# Altium footprint library Elettronica FM.PcbLib: 387 footprints (part 1 of 25)
Each footprint in its own frame and in the unit in brackets; x right, y up, seen from the top. Pads: shape width x height; smd on the part's side, far side on the other; paste and mask are expansions set on the pad; w line width, h text height; cw(c..) or ccw(c..) is an arc to the next point about the centre after c.
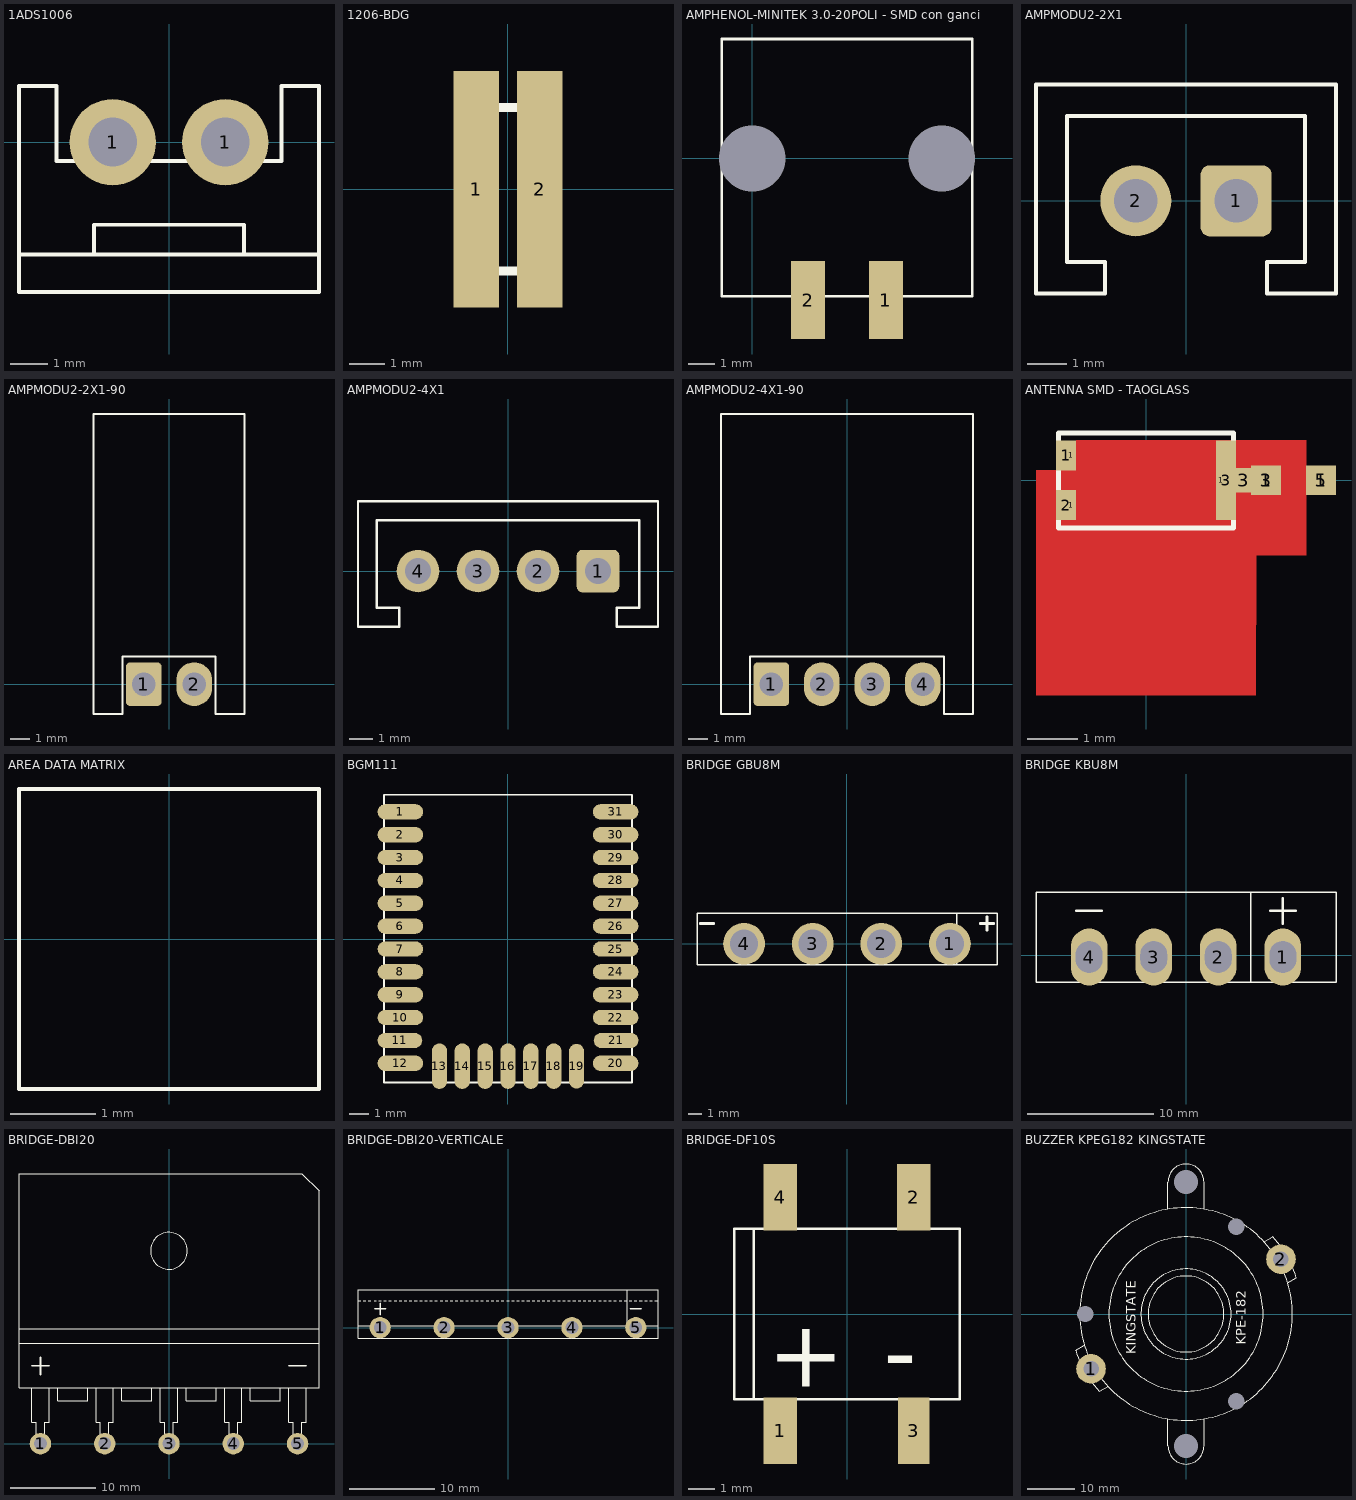
[diagram p0: the footprints below, top view; thin cyan lines are the x and y axes]

## 1ADS1006 [mm]
pads (2):
  round 2.3 hole 1.3: 1(-1.5,0) 1(1.5,0)
Top Overlay:
  lines w0.1: -4,-3 4,-3 ; -2,-3 -2,-2.2 2,-2.2 2,-3 ; -4,-4 -4,1.5 -3,1.5 -3,-0.5 -2,-0.5 -2,0.5 -1,0.5 -1,-0.5 1,-0.5 1,0.5 2,0.5 2,-0.5 3,-0.5 3,1.5 4,1.5 4,-4 -4,-4
3D body: height 9, standoff 0, extent -4,-4 4,-3
3D body: height 1, standoff 0, extent -4,-4 4,1.5
3D body: height 0, standoff -4.5, extent -2,-0.5 -1,0.5
3D body: height 0, standoff -4.5, extent 1,-0.5 2,0.5
3D body: height 6.35, standoff 3.65, extent -1.345,-4.025 1.345,-2.975

## 1206-BDG [mil]
pads (2):
  rect 50x260 smd paste-275.59: 1(-35,0) 2(35,0)
Top Overlay:
  lines w10: -43,-90 -43,90 43,90 43,-90 -43,-90
Top Paste:
  region: 35.74,130.47 35.74,28.11 10.15,28.11 10.15,130.47
  region: 35.59,-27.64 35.59,-130 10,-130 10,-27.64
  region: -9.41,-27.64 -9.41,-130 -35,-130 -35,-27.64
  region: -9.54,130.47 -9.54,28.11 -35.13,28.11 -35.13,130.47
Top Solder:
  region: -9.54,130.47 -9.54,28.11 -35.13,28.11 -35.13,130.47
  region: 35.59,-27.64 35.59,-130 10,-130 10,-27.64
  region: -9.41,-27.64 -9.41,-130 -35,-130 -35,-27.64
  region: 35.74,130.47 35.74,28.11 10.15,28.11 10.15,130.47

## AMPHENOL-MINITEK 3.0-20POLI - SMD con ganci [mm]
height 40.5
pads (4):
  round 0 hole 2.55 unplated mask+0.1: 0(0,0) 0(7.3,0)
  rect 1.3x3 smd mask+0.1: 1(5.15,-5.45) 2(2.15,-5.45)
Top Overlay:
  lines w0.1: -1.175,-5.3 -1.175,4.6 8.475,4.6 8.475,-5.3 -1.175,-5.3
3D body "s10137867-02xxlf.stp": height 5.53, standoff -2.03, extent -1.446,-6.4 8.746,4.6

## AMPMODU2-2X1 [mm]
pads (2):
  rrect25% 1.8x1.8 hole 1.1: 1(1.27,0)
  round 1.8 hole 1.1: 2(-1.27,0)
Top Overlay:
  lines w0.1: -3.8,-2.35 -2.05,-2.35 -2.05,-1.55 -3.01,-1.55 -3.01,2.15 3.01,2.15 3.01,-1.55 2.05,-1.55 2.05,-2.35 3.8,-2.35 3.8,2.95 -3.8,2.95 -3.8,-2.35
3D body "c-280370-2-u-3d.stp": height 12.6, standoff -3.5, extent -3.685,-2.21 3.685,2.79

## AMPMODU2-2X1-90 [mm]
pads (2):
  rrect25% 1.8x2.2 hole 1.2: 1(-1.27,0)
  oval 1.8x2.2 hole 1.2: 2(1.27,0)
Top Overlay:
  lines w0.1: 2.335,-1.5 2.335,1.4 -2.335,1.4 -2.335,-1.5 -3.81,-1.5 -3.81,13.6 3.81,13.6 3.81,-1.5 2.36,-1.5
3D body "c-280377-1-s-3d.stp": height 5, standoff -3.5, extent -3.68,-1.5 3.68,13.35

## AMPMODU2-4X1 [mm]
pads (4):
  rrect25% 1.8x1.8 hole 1.1: 1(3.81,0)
  round 1.8 hole 1.1: 2(1.27,0) 3(-1.27,0) 4(-3.81,0)
Top Overlay:
  lines w0.1: -6.35,-2.35 -4.6,-2.35 -4.6,-1.55 -5.55,-1.55 -5.55,2.15 5.55,2.15 5.55,-1.55 4.6,-1.55 4.6,-2.35 6.35,-2.35 6.35,2.95 -6.35,2.95 -6.35,-2.35
3D body "c-280371-1-u-3d.stp": height 12.6, standoff -3.5, extent -6.225,-2.21 6.225,2.79

## AMPMODU2-4X1-90 [mm]
pads (4):
  rrect25% 1.8x2.2 hole 1.2: 1(-3.81,0)
  oval 1.8x2.2 hole 1.2: 2(-1.27,0) 3(1.27,0) 4(3.81,0)
Top Overlay:
  lines w0.1: 4.875,-1.5 4.875,1.4 -4.875,1.4 -4.875,-1.5 -6.35,-1.5 -6.35,13.6 6.35,13.6 6.35,-1.5 4.9,-1.5
3D body "c-280378-1-s-3d.stp": height 5, standoff -3.5, extent -6.225,-1.5 6.225,13.35

## ANTENNA SMD - TAOGLASS [mm]
height 1.9
pads (11):
  rect 0.4x0.6 smd paste-5 mask+0.1: 1(-1.6,0.5) 2(-1.6,-0.5)
  rect 0.2x0.6 on Top Paste paste+0 mask+0.05: 1(-1.5,-0.5) 1(-1.5,0.5)
  rect 0.2x1.6 on Top Paste paste+0 mask+0.05: 1(1.5,0)
  rect 0.6x0.6 on Top Paste paste+0 mask+0.05: 1(2.4,0) 1(3.5,0)
  rect 0.4x1.6 smd paste-5 mask+0.1: 3(1.6,0)
  rect 0.6x0.5 smd paste-5 mask+0.1: 3(1.95,0)
  rect 0.6x0.6 smd paste-5 mask+0.1: 3(2.4,0) 5(3.5,0)
Top Layer:
  pour cut-out: 3.2,0.8 3.2,-1.5 2.2,-1.5 2.2,-4.3 -2.2,-4.3 -2.2,0.2 -1.4,0.2 -1.4,0.8
Top Overlay:
  lines w0.1: -1.75,-0.95 -1.75,0.95 1.75,0.95 1.75,-0.95 -1.75,-0.95
3D body: height 0.8, standoff 0, extent -1.75,-0.95 1.75,0.95

## AREA DATA MATRIX [mm]
height 1.9
Top Overlay:
  lines w0.05: -1.75,-1.75 -1.75,1.75 1.75,1.75 1.75,-1.75 -1.75,-1.75

## BGM111 [mm]
pads (31):
  oval 2.4x0.8 smd mask+0.1: 1(-5.65,6.675) 2(-5.65,5.475) 3(-5.65,4.275) 4(-5.65,3.075) 5(-5.65,1.875) 6(-5.65,0.675) 7(-5.65,-0.525) 8(-5.65,-1.725) 9(-5.65,-2.925) 10(-5.65,-4.125) 12(-5.65,-6.525) 20(5.65,-6.525) 22(5.65,-4.125) 23(5.65,-2.925) 24(5.65,-1.725) 25(5.65,-0.525) 26(5.65,0.675) 27(5.65,1.875) 28(5.65,3.075) 29(5.65,4.275) 30(5.65,5.475) 31(5.65,6.675)
  oval 2.35x0.8 smd mask+0.1: 11(-5.675,-5.325) 21(5.675,-5.325)
  oval 0.8x2.4 smd mask+0.1: 13(-3.6,-6.675) 14(-2.4,-6.675) 15(-1.2,-6.675) 16(0,-6.675) 17(1.2,-6.675) 18(2.4,-6.675)
  oval 0.8x2.35 smd mask+0.1: 19(3.6,-6.675)
Top Overlay:
  lines w0.1: -6.5,-7.525 -6.5,7.575 6.5,7.575 6.5,-7.525 -6.5,-7.525
Multi-Layer:
  pour cut-out: -3.85,7.525 -3.85,4.025 3.75,4.025 3.75,7.525
3D body: height 2.1, standoff 0, extent -6.5,-7.525 6.5,7.575

## BRIDGE GBU8M [mm]
height 24.5
pads (4):
  round 3.1 hole 2.1: 1(7.65,0) 2(2.55,0) 3(-2.55,0) 4(-7.65,0)
Top Overlay:
  lines w0.1: 8.15,-1.55 8.15,2.25 ; -11.15,-1.55 11.15,-1.55 11.15,2.25 -11.15,2.25 -11.15,-1.55
  lines w0.2: -10.9,1.5 -9.9,1.5 ; 9.9,1.5 10.9,1.5 ; 10.4,1 10.4,2
3D body: height 12.75, standoff 7.25, extent -1.8,-1.575 1.8,2.275
3D body: height 18.8, standoff 2.7, extent -11.15,-1.55 11.15,2.25
3D body: height 18.82, standoff 15.8, extent 8.15,-1.575 11.175,2.275
3D body: height 2.7, standoff 0, extent -3.8,-0.3 -1.3,0.3
3D body: height 0, standoff -4, extent -3.2,-0.3 -1.9,0.3
3D body: height 0, standoff -4, extent -8.3,-0.3 -7,0.3
3D body: height 2.7, standoff 0, extent -8.9,-0.3 -6.4,0.3
3D body: height 0, standoff -4, extent 1.9,-0.3 3.2,0.3
3D body: height 2.7, standoff 0, extent 1.3,-0.3 3.8,0.3
3D body: height 0, standoff -4, extent 7,-0.3 8.3,0.3
3D body: height 2.7, standoff 0, extent 6.4,-0.3 8.9,0.3

## BRIDGE KBU8M [mm]
height 24.5
pads (4):
  oval 2.9x4.5 hole 2.1 slot 2.5 at 90 deg: 1(7.65,-0.15) 2(2.55,-0.15) 3(-2.55,-0.15) 4(-7.65,-0.15)
Top Overlay:
  lines w0.1: 5.1,-2.15 5.1,4.95 ; -11.85,-2.15 -11.85,4.95 11.85,4.95 11.85,-2.15 -11.85,-2.15
  lines w0.2: -8.65,3.5 -6.65,3.5 ; 6.65,3.5 8.65,3.5 ; 7.65,2.5 7.65,4.5
3D body: height 1.5, standoff -4.3, extent -8.295,-0.649 -7,0.649
3D body: height 1.5, standoff -4.3, extent -3.195,-0.649 -1.9,0.649
3D body: height 1.5, standoff -4.3, extent 1.905,-0.649 3.2,0.649
3D body: height 1.5, standoff -4.3, extent 7.005,-0.649 8.3,0.649
3D body: height 19.33, standoff 15.3, extent 9.15,-2.175 11.875,4.975
3D body: height 19.3, standoff 1.5, extent -9.15,-2.15 9.15,4.95
3D body: height 19.3, standoff 0, extent 9.15,-2.15 11.85,4.95
3D body: height 19.3, standoff 0, extent -11.85,-2.15 -9.15,4.95

## BRIDGE-DBI20 [mm]
pads (5):
  round 2.5 hole 1.5: 1(-15,0) 2(-7.5,0) 3(0,0) 4(7.5,0) 5(15,0)
Top Overlay:
  circle w0.1: c0,22.5 r2.15
  lines w0.1: -17.5,11.7 17.475,11.7 ; -17.5,13.4 17.5,13.4 ; -16,6.5 -16,2.5 -15.5,2.5 -15.5,-0.25 -14.5,-0.25 -14.5,2.5 -14,2.5 -14,6.5 ; -13,6.5 -13,5 -9.5,5 -9.5,6.5 ; -8.5,6.5 -8.5,2.5 -8,2.5 -8,-0.25 -7,-0.25 -7,2.5 -6.5,2.5 -6.5,6.5 ; -5.5,6.5 -5.5,5 -2,5 -2,6.5 ; -1,6.5 -1,2.5 -0.5,2.5 -0.5,-0.25 0.5,-0.25 0.5,2.5 1,2.5 1,6.5 ; 2,6.5 2,5 5.5,5 5.5,6.5 ; 6.5,6.5 6.5,2.5 7,2.5 7,-0.25 8,-0.25 8,2.5 8.5,2.5 8.5,6.5 ; 9.5,6.5 9.5,5 13,5 13,6.5 ; 14,6.5 14,2.5 14.5,2.5 14.5,-0.25 15.5,-0.25 15.5,2.5 16,2.5 16,6.5 ; -17.5,6.5 -17.5,31.5 15.5,31.5 17.5,29.5 17.5,6.5 -17.5,6.5
  lines w0.2: -16,9.075 -14,9.075 ; -15,8.075 -15,10.075 ; 14,9.075 16,9.075
3D body: height 5.7, standoff 1.3, extent 9.5,5 13,6.5
3D body: height 5.7, standoff 1.3, extent 2,5 5.5,6.5
3D body: height 5.7, standoff 1.3, extent -5.5,5 -2,6.5
3D body: height 5.7, standoff 1.3, extent -13,5 -9.5,6.5
3D body: height 4.7, standoff 4.2, extent 14,2.5 16,6.5
3D body: height 4.7, standoff 4.2, extent 14.5,-0.25 15.5,2.5
3D body: height 4.7, standoff -4.3, extent 14.5,-0.25 15.5,0.25
3D body: height 4.7, standoff 4.2, extent 6.5,2.5 8.5,6.5
3D body: height 4.7, standoff 4.2, extent 7,-0.25 8,2.5
3D body: height 4.7, standoff -4.3, extent 7,-0.25 8,0.25
3D body: height 4.7, standoff 4.2, extent -1,2.5 1,6.5
3D body: height 4.7, standoff 4.2, extent -0.5,-0.25 0.5,2.5
3D body: height 4.7, standoff -4.3, extent -0.5,-0.25 0.5,0.25
3D body: height 4.7, standoff 4.2, extent -8.5,2.5 -6.5,6.5
3D body: height 4.7, standoff 4.2, extent -8,-0.25 -7,2.5
3D body: height 4.7, standoff -4.3, extent -8,-0.25 -7,0.25
3D body: height 4.3, standoff 0, extent -2.15,20.353 2.15,24.647
3D body: height 4.7, standoff -4.3, extent -15.5,-0.25 -14.5,0.25
3D body: height 4.7, standoff 4.2, extent -15.5,-0.25 -14.5,2.5
3D body: height 4.7, standoff 4.2, extent -16,2.5 -14,6.5
3D body: height 4.2, standoff 0, extent -17.5,11.7 17.5,31.5
3D body: height 5.7, standoff 1.3, extent -17.5,6.5 17.5,11.7

## BRIDGE-DBI20-VERTICALE [mm]
pads (5):
  round 2.5 hole 1.5: 1(-15,0) 2(-7.5,0) 3(0,0) 4(7.5,0) 5(15,0)
Top Overlay:
  lines w0.1: -17.6,0.25 17.6,0.25 ; -17.6,3.15 -17.275,3.15 ; -16.975,3.15 -16.675,3.15 ; -16.375,3.15 -16.075,3.15 ; -15.7,3.15 -15.475,3.15 ; -15.175,3.15 -14.875,3.15 ; -14.575,3.15 -14.275,3.15 ; -13.975,3.15 -13.675,3.15 ; -13.375,3.15 -13.075,3.15 ; -12.775,3.15 -12.475,3.15 ; -12.175,3.15 -11.875,3.15 ; -11.575,3.15 -11.275,3.15 ; -10.975,3.15 -10.675,3.15 ; -10.375,3.15 -10.075,3.15 ; -9.775,3.15 -9.475,3.15 ; -9.175,3.15 -8.875,3.15 ; -8.575,3.15 -8.275,3.15 ; -7.975,3.15 -7.675,3.15 ; -7.375,3.15 -7.075,3.15 ; -6.775,3.15 -6.475,3.15 ; -6.175,3.15 -5.875,3.15 ; -5.575,3.15 -5.275,3.15 ; -4.975,3.15 -4.675,3.15 ; -4.375,3.15 -4.075,3.15 ; -3.775,3.15 -3.475,3.15 ; -3.175,3.15 -2.875,3.15 ; -2.575,3.15 -2.275,3.15 ; -1.975,3.15 -1.675,3.15 ; -1.375,3.15 -1.075,3.15 ; -0.775,3.15 -0.475,3.15 ; -0.175,3.15 0.125,3.15 ; 0.425,3.15 0.725,3.15 ; 1.025,3.15 1.325,3.15 ; 1.625,3.15 1.925,3.15 ; 2.225,3.15 2.525,3.15 ; 2.825,3.15 3.125,3.15 ; 3.425,3.15 3.725,3.15 ; 4.025,3.15 4.325,3.15 ; 4.625,3.15 4.925,3.15 ; 5.225,3.15 5.525,3.15 ; 5.825,3.15 6.125,3.15 ; 6.425,3.15 6.725,3.15 ; 7.025,3.15 7.325,3.15 ; 7.625,3.15 7.925,3.15 ; 8.225,3.15 8.525,3.15 ; 8.825,3.15 9.125,3.15 ; 9.425,3.15 9.725,3.15 ; 10.025,3.15 10.325,3.15 ; 10.625,3.15 10.925,3.15 ; 11.225,3.15 11.525,3.15 ; 11.825,3.15 12.125,3.15 ; 12.425,3.15 12.725,3.15 ; 13.025,3.15 13.325,3.15 ; 13.625,3.15 13.925,3.15 ; 14,0.25 14,4.45 ; 14.225,3.15 14.525,3.15 ; 14.825,3.15 15.125,3.15 ; 15.425,3.15 15.725,3.15 ; 16.025,3.15 16.325,3.15 ; 16.625,3.15 16.925,3.15 ; 17.225,3.15 17.6,3.15 ; -17.6,-1.25 17.6,-1.25 17.6,4.45 -17.6,4.45 -17.6,-1.25
  lines w0.2: -15.65,2.225 -14.35,2.225 ; -15,1.55 -15,2.875 ; 14.35,2.225 15.65,2.225
3D body: height 4, standoff 0, extent 6.5,-0.25 8.5,0.25
3D body: height 0, standoff -3.5, extent 7,-0.25 8,0.25
3D body: height 4, standoff 0, extent 14,-0.25 16,0.25
3D body: height 0, standoff -3.5, extent 14.5,-0.25 15.5,0.25
3D body: height 4, standoff 0, extent -16,-0.25 -14,0.25
3D body: height 0, standoff -3.5, extent -15.5,-0.25 -14.5,0.25
3D body: height 4, standoff 0, extent -8.5,-0.25 -6.5,0.25
3D body: height 0, standoff -3.5, extent -8,-0.25 -7,0.25
3D body: height 0, standoff -3.5, extent -0.5,-0.25 0.5,0.25
3D body: height 4, standoff 0, extent -1,-0.25 1,0.25
3D body: height 4, standoff 1.5, extent 9.5,-0.55 13,0.95
3D body: height 4, standoff 1.5, extent 2,-0.55 5.5,0.95
3D body: height 4, standoff 1.5, extent -5.5,-0.55 -2,0.95
3D body: height 4, standoff 1.5, extent -13,-0.55 -9.5,0.95
3D body: height 8.7, standoff 4, extent -17.6,-1.25 17.6,3.15
3D body: height 29, standoff 8.7, extent -17.6,0.25 14,4.45
3D body: height 25.4, standoff 8.7, extent 14,0.25 17.6,4.45
3D body: height 22.15, standoff 17.85, extent -2.15,0.2 2.15,4.5
3D body: height 29, standoff 21.8, extent 10.4,0.25 17.6,4.45

## BRIDGE-DF10S [mm]
height 1.9
pads (4):
  rect 1.27x2.54 smd: 1(-2.54,-4.445) 2(2.54,4.445) 4(-2.54,4.445)
  rect 1.2x2.54 smd: 3(2.54,-4.445)
Top Overlay:
  lines w0.1: -3.556,-3.25 -3.556,3.25 ; -4.3,-3.25 4.3,-3.25 4.3,3.25 -4.3,3.25 -4.3,-3.25
  text "+" at -3.025,-2.775 h2.54
  text "-" at 1.4,-2.7 h2.54
3D body: height 3, standoff 0, extent -4.3,-3.25 4.3,3.25

## BUZZER KPEG182 KINGSTATE [mm]
height 24.5
pads (7):
  round 0 hole 3.45 unplated mask+0.1: 0(-21.2,0) 0(10.6,-18.36) 0(10.6,18.36)
  round 0 hole 5 unplated mask+0.1: 0(0,-27.8) 0(0,27.8)
  round 6.25 hole 3.25 mask+0.1: 1(-20.005,-11.55) 2(20.005,11.55)
Top Overlay:
  circle w0.1: c0,0 r22.4
  circle w0.1: c0,27.8 r2
  circle w0.1: c0,-27.8 r2
  circle w0.1: c0,0 r16.25
  circle w0.1: c0,0 r9.5
  circle w0.1: c0,0 r8
  lines w0.1: -23.271,-7.662 ccw(c0,0) -18.272,-16.322 -16.423,-15.255 ; -23.271,-7.662 -21.423,-6.595 ; -3.8,-22.075 -3.8,-27.8 ccw(c0,-27.8) 3.8,-27.8 3.8,-22.075 ; -3.8,22.075 -3.8,27.8 cw(c0,27.8) 3.8,27.8 3.8,22.075 ; 16.423,15.255 18.271,16.322 cw(c0,0) 23.271,7.662 ; 21.423,6.595 23.271,7.662
  text "KPE-182" at 12.575,-6.5 h2
  text "KINGSTATE" at -10.575,-8.5 h2
3D body: height 18.2, standoff 14.4, extent -3.8,-27.8 3.8,27.8
3D body: height 18.2, standoff 14.4, extent -3.8,-31.6 3.8,-24
3D body: height 18.2, standoff 14.4, extent -3.8,24 3.8,31.6
3D body: height 18.2, standoff 4.6, extent -22.4,-22.394 22.4,22.394
3D body: height 18.3, standoff 18.2, extent -8,-8 8,8
3D body: height 16, standoff 0, extent -22.862,-16.086 -17.148,-7.026
3D body: height 16, standoff -3.5, extent -21.052,-12.969 -18.959,-10.144
3D body: height 16, standoff -3.5, extent 18.959,10.144 21.052,12.969
3D body: height 16, standoff 0, extent 17.148,7.026 22.862,16.086